# Altium footprint library Sajad_Altium_Library.PcbLib: 333 footprints (part 8 of 21)
Each footprint in its own frame and in the unit in brackets; x right, y up, seen from the top. Pads: shape width x height; smd on the part's side, far side on the other; paste and mask are expansions set on the pad; w line width, h text height; cw(c..) or ccw(c..) is an arc to the next point about the centre after c.
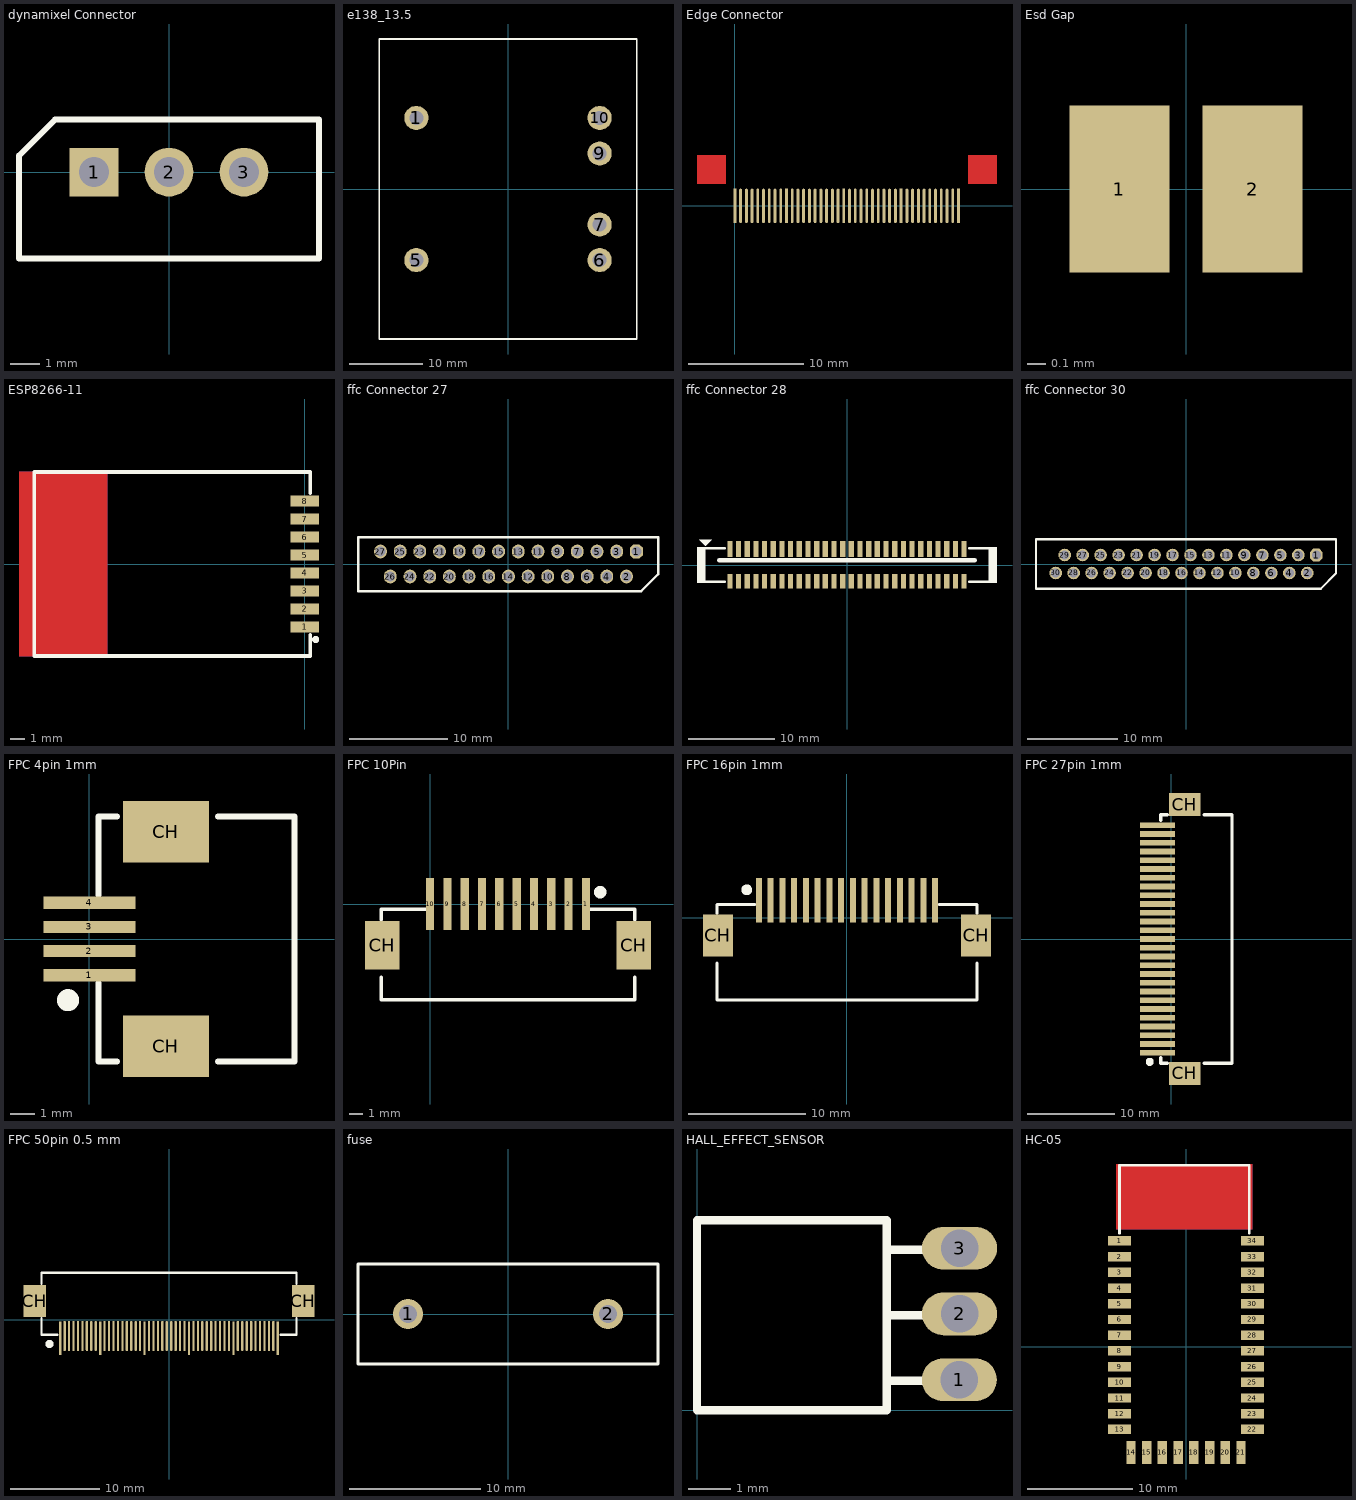
[diagram p7: the footprints below, top view; thin cyan lines are the x and y axes]

## dynamixel Connector [mil] "Dynamixel connector"
pads (3):
  rect 65x65 hole 40: 1(-100,0)
  round 65 hole 40: 2(0,0) 3(100,0)
Top Overlay:
  lines w7.87: -200,-115 -200,22 -152,70 200,70 200,-115 -200,-115

## e138_13.5 [mil] "On Board Transformer"
pads (6):
  round 130 hole 75: 1(-495,384) 5(-495,-384) 6(495,-384) 7(495,-192) 9(495,192) 10(495,384)
Top Overlay:
  lines w10: -695,-810 -695,810 695,810 695,-810 -695,-810
3D body: height 1200, standoff 0, extent -700,-815 700,815

## Edge Connector [mm]
height 1.7
pads (40):
  rect 0.25x3 smd: 1(19.5,0) 11(14.5,0) 21(9.5,0) 31(4.5,0) 40(0,0)
  oval 0.25x3 smd: 2(19,0) 3(18.5,0) 4(18,0) 5(17.5,0) 6(17,0) 7(16.5,0) 8(16,0) 9(15.5,0) 10(15,0) 12(14,0) 13(13.5,0) 14(13,0) 15(12.5,0) 16(12,0) 17(11.5,0) 18(11,0) 19(10.5,0) 20(10,0) 22(9,0) 23(8.5,0) 24(8,0) 25(7.5,0) 26(7,0) 27(6.5,0) 28(6,0) 29(5.5,0) 30(5,0) 32(4,0) 33(3.5,0) 34(3,0) 35(2.5,0) 36(2,0) 37(1.5,0) 38(1,0) 39(0.5,0)
Top Layer:
  rectangle: -3.302,1.905 -0.762,4.445
  rectangle: 20.32,1.905 22.86,4.445
3D body: height 1.24, standoff -0.03, extent -3.071,0.381 22.629,4.638

## Esd Gap [mil] "Esp Gap"
pads (2):
  rect 21x35 smd mask+3: 1(-14,0) 2(14,0)

## ESP8266-11 [mm]
height 1.7
pads (8):
  rect 2x0.762 smd: 1(0,-4.445) 2(0,-3.175) 3(0,-1.905) 4(0,-0.635) 5(0,0.635) 6(0,1.905) 7(0,3.175) 8(0,4.445)
Top Layer:
  pour cut-out: -20.193,-6.5 -20.193,6.5 -13.97,6.5 -13.97,-6.5
Bottom Layer:
  pour cut-out: -20.193,-6.5 -20.193,6.5 -13.97,6.5 -13.97,-6.5
Top Overlay:
  circle w0.25: c0.762,-5.334 r0.125
  lines w0.254: 0.381,-5 0.381,-6.5 -19.119,-6.5 -19.119,6.5 0.381,6.5 0.381,5

## ffc Connector 27 [mm] "ffc Connector 27"
pads (27):
  oct 1.3x1.397 hole 1: 1(13,1.27)
  oval 1.3x1.397 hole 1: 2(12,-1.27) 3(11,1.27) 4(10,-1.27) 5(9,1.27) 6(8,-1.27) 7(7,1.27) 8(6,-1.27) 9(5,1.27) 10(4,-1.27) 11(3,1.27) 12(2,-1.27) 13(1,1.27) 14(0,-1.27) 15(-1,1.27) 16(-2,-1.27) 17(-3,1.27) 18(-4,-1.27) 19(-5,1.27) 20(-6,-1.27) 21(-7,1.27) 22(-8,-1.27) 23(-9,1.27) 24(-10,-1.27) 25(-11,1.27) 26(-12,-1.27) 27(-13,1.27)
Top Overlay:
  lines w0.254: -15.283,-2.743 -15.283,2.743 15.197,2.743 15.197,-1.041 13.495,-2.743 -15.283,-2.743
3D body: height 5.5, standoff -3.01, extent -15.043,-1.3 14.957,1.3

## ffc Connector 28 [mm] "Molex Part Number: 52610-0533"
pads (56):
  rect 0.6x1.65 smd: 1(-13.5,-1.875) 2(-12.5,-1.875) 3(-11.5,-1.875) 4(-10.5,-1.875) 5(-9.5,-1.875) 6(-8.5,-1.875) 7(-7.5,-1.875) 8(-6.5,-1.875) 9(-5.5,-1.875) 10(-4.5,-1.875) 11(-3.5,-1.875) 12(-2.5,-1.875) 13(-1.5,-1.875) 14(-0.5,-1.875) 15(0.5,-1.875) 16(1.5,-1.875) 17(2.5,-1.875) 18(3.5,-1.875) 19(4.5,-1.875) 20(5.5,-1.875) 21(6.5,-1.875) 22(7.5,-1.875) 23(8.5,-1.875) 24(9.5,-1.875) 25(10.5,-1.875) 26(11.5,-1.875) 27(12.5,-1.875) 28(13.5,-1.875)
  rect 0.6x1.85 smd: 1(-13.5,1.875) 2(-12.5,1.875) 3(-11.5,1.875) 4(-10.5,1.875) 5(-9.5,1.875) 6(-8.5,1.875) 7(-7.5,1.875) 8(-6.5,1.875) 9(-5.5,1.875) 10(-4.5,1.875) 11(-3.5,1.875) 12(-2.5,1.875) 13(-1.5,1.875) 14(-0.5,1.875) 15(0.5,1.875) 16(1.5,1.875) 17(2.5,1.875) 18(3.5,1.875) 19(4.5,1.875) 20(5.5,1.875) 21(6.5,1.875) 22(7.5,1.875) 23(8.5,1.875) 24(9.5,1.875) 25(10.5,1.875) 26(11.5,1.875) 27(12.5,1.875) 28(13.5,1.875)
Top Overlay:
  region: -16.422,2.057 -17.297,2.057 -17.297,-2.057 -16.422,-2.057
  rectangle: 16.422,-2.057 17.297,2.057
  region: -17.031,2.946 -15.583,2.946 -16.294,2.235 -16.319,2.235
  lines w0.254: -14.072,-1.93 -16.425,-1.93 -16.425,1.93 -14.072,1.93 ; 14.072,-1.93 16.425,-1.93 16.425,1.93 14.072,1.93
  lines w0.508: -14.732,0.559 14.732,0.559
3D body: height 5.7, standoff -0.05, extent -17.3,-2.29 17.3,2.21

## ffc Connector 30 [mm] "ffc Connector 30"
pads (30):
  oct 1.397x1.397 hole 1: 1(14.5,1)
  round 1.397 hole 1: 2(13.5,-1) 3(12.5,1) 4(11.5,-1) 5(10.5,1) 6(9.5,-1) 7(8.5,1) 8(7.5,-1) 9(6.5,1) 10(5.5,-1) 11(4.5,1) 12(3.5,-1) 13(2.5,1) 14(1.5,-1) 15(0.5,1) 16(-0.5,-1) 17(-1.5,1) 18(-2.5,-1) 19(-3.5,1) 20(-4.5,-1) 21(-5.5,1) 22(-6.5,-1) 23(-7.5,1) 24(-8.5,-1) 25(-9.5,1) 26(-10.5,-1) 27(-11.5,1) 28(-12.5,-1) 29(-13.5,1) 30(-14.5,-1)
Top Overlay:
  lines w0.254: -16.383,2.743 -16.697,2.743 ; -16.697,2.743 -16.697,-2.743 14.995,-2.743 16.697,-1.041 16.697,2.743 -16.697,2.743

## FPC 4pin 1mm [mil] "Touch Connector"
height 66.93
pads (6):
  rect 150x20 smd: 1(0,-59.06) 2(0,-19.68) 3(0,19.69) 4(0,59.06)
  rect 140x100 smd: CH(125,-175) CH(125,175)
Top Overlay:
  circle w24: c-35,-100 r6
  lines w10: 15,-71.77 15,-200 45,-200 ; 15,71.77 15,200 45,200 ; 210,-200 335,-200 335,-15 335,200 210,200
3D body: height 106.15, standoff -0.15, extent -13.98,-202.75 336.42,202.76

## FPC 10Pin [mm] "Chess Connector"
height 1.7
pads (12):
  rect 0.6x3.81 smd: 1(11.43,0) 2(10.16,0) 3(8.89,0) 4(7.62,0) 5(6.35,0) 6(5.08,0) 7(3.81,0) 8(2.54,0) 9(1.27,0) 10(0,0)
  rect 2.54x3.556 smd: CH(-3.5,-3) CH(14.93,-3)
Top Overlay:
  circle w0.61: c12.47,0.889 r0.152
  lines w0.254: -3.581,-7 15.011,-7 ; -3.58,-7 -3.58,-5.334 ; -3.58,-1.143 -3.58,-0.381 -0.323,-0.381 ; 11.753,-0.381 15.01,-0.381 15.01,-1.143 ; 15.01,-7 15.01,-5.334

## FPC 16pin 1mm [mm] "Chess Connector"
height 1.7
pads (18):
  rect 0.508x3.81 smd: 1(-7.5,1.5) 2(-6.5,1.5) 3(-5.5,1.5) 4(-4.5,1.5) 5(-3.5,1.5) 6(-2.5,1.5) 7(-1.5,1.5) 8(-0.5,1.5) 9(0.5,1.5) 10(1.5,1.5) 11(2.5,1.5) 12(3.5,1.5) 13(4.5,1.5) 14(5.5,1.5) 15(6.5,1.5) 16(7.5,1.5)
  rect 2.54x3.556 smd: CH(-11,-1.5) CH(11,-1.5)
Top Overlay:
  circle w0.61: c-8.54,2.389 r0.152
  lines w0.254: -11.081,-7.009 11.08,-7.009 11.08,-3.834 ; -11.08,-7.009 -11.08,-3.834 ; -11.08,0.357 -11.08,1.119 -7.823,1.119 ; 7.823,1.119 11.08,1.119 11.08,0.357

## FPC 27pin 1mm [mm] "1027-A0 FPC1.0"
height 1.7
pads (29):
  rect 4x0.65 smd: 1(-1.556,-13) 2(-1.556,-12) 3(-1.556,-11) 4(-1.556,-10) 5(-1.556,-9) 6(-1.556,-8) 7(-1.556,-7) 8(-1.556,-6) 9(-1.556,-5) 10(-1.556,-4) 11(-1.556,-3) 12(-1.556,-2) 13(-1.556,-1) 14(-1.556,0) 15(-1.556,1) 16(-1.556,2) 17(-1.556,3) 18(-1.556,4) 19(-1.556,5) 20(-1.556,6) 21(-1.556,7) 22(-1.556,8) 23(-1.556,9) 24(-1.556,10) 25(-1.556,11) 26(-1.556,12) 27(-1.556,13)
  rect 3.556x2.6 smd: CH(1.556,-15.367) CH(1.556,15.367)
Top Overlay:
  circle w0.61: c-2.445,-14.04 r0.152
  lines w0.381: -1.175,-13.589 -1.175,-14.2 -0.413,-14.2 ; -1.175,13.589 -1.175,14.2 -0.413,14.2 ; 3.778,-14.2 6.953,-14.2 6.953,14.2 3.778,14.2

## FPC 50pin 0.5 mm [mil] "FPC 50pin .5 mm"
height 66.93
pads (52):
  rect 9.84x150 smd: 1(-482.28,-82.5) 10(-305.12,-82.5) 20(-108.27,-82.5) 30(88.58,-82.5) 40(285.43,-82.5) 50(482.28,-82.5)
  oval 9.84x134 smd: 2(-462.6,-72.5) 3(-442.91,-72.5) 4(-423.23,-72.5) 5(-403.54,-72.5) 6(-383.86,-72.5) 7(-364.17,-72.5) 8(-344.49,-72.5) 9(-324.8,-72.5) 11(-285.43,-72.5) 12(-265.75,-72.5) 13(-246.06,-72.5) 14(-226.38,-72.5) 15(-206.69,-72.5) 16(-187.01,-72.5) 17(-167.32,-72.5) 18(-147.64,-72.5) 19(-127.95,-72.5) 21(-88.58,-72.5) 22(-68.9,-72.5) 23(-49.21,-72.5) 24(-29.53,-72.5) 25(-9.84,-72.5) 26(9.84,-72.5) 27(29.53,-72.5) 28(49.21,-72.5) 29(68.9,-72.5) 31(108.27,-72.5) 32(127.95,-72.5) 33(147.64,-72.5) 34(167.32,-72.5) 35(187.01,-72.5) 36(206.69,-72.5) 37(226.38,-72.5) 38(246.06,-72.5) 39(265.75,-72.5) 41(305.12,-72.5) 42(324.8,-72.5) 43(344.49,-72.5) 44(364.17,-72.5) 45(383.86,-72.5) 46(403.54,-72.5) 47(423.23,-72.5) 48(442.91,-72.5) 49(462.6,-72.5)
  rect 100x140 smd: CH(-595,82.5) CH(595,82.5)
Top Overlay:
  circle w24: c-530,-107.5 r6
  lines w10: -565,7.5 -565,-67.5 -495,-67.5 ; -565,157.5 -565,207.5 565,207.5 565,157.5 ; 495,-67.5 565,-67.5 565,7.5
3D body: height 78.74, standoff -1.97, extent -600.4,-73.63 600.38,207.87

## fuse [mil]
pads (2):
  round 90 hole 55: 1(-300,0) 2(300,0)
Top Overlay:
  lines w7.87: -450,-150 450,-150 450,150 -450,150 -450,-150
3D body: height 561.5, standoff -63.14, extent -472.44,-182.85 472.44,174.72

## HALL_EFFECT_SENSOR [mil]
pads (3):
  oval 70x40 hole 35: 1(244.82,28.38) 2(245.04,89.86) 3(245.04,151.13)
Top Overlay:
  lines w7.87: 177.17,27.56 236.22,27.56 ; 177.17,88.58 236.22,88.58 ; 177.17,149.61 236.22,149.61 ; 0,0 177.17,0 177.17,177.17 0,177.17 0,0

## HC-05 [mm] "Bluetooth module footprint"
height 1.7
pads (34):
  rect 2.2x0.9 smd: 1(-6.35,10.1) 2(-6.35,8.6) 3(-6.35,7.1) 4(-6.35,5.6) 5(-6.35,4.1) 6(-6.35,2.6) 7(-6.35,1.1) 8(-6.35,-0.4) 9(-6.35,-1.9) 10(-6.35,-3.4) 11(-6.35,-4.9) 12(-6.35,-6.4) 13(-6.35,-7.9) 22(6.35,-7.9) 23(6.35,-6.4) 24(6.35,-4.9) 25(6.35,-3.4) 26(6.35,-1.9) 27(6.35,-0.4) 28(6.35,1.1) 29(6.35,2.6) 30(6.35,4.1) 31(6.35,5.6) 32(6.35,7.1) 33(6.35,8.6) 34(6.35,10.1)
  rect 0.9x2.2 smd: 14(-5.25,-10.1) 15(-3.75,-10.1) 16(-2.25,-10.1) 17(-0.75,-10.1) 18(0.75,-10.1) 19(2.25,-10.1) 20(3.75,-10.1) 21(5.25,-10.1)
Top Layer:
  pour cut-out: -6.654,17.449 6.346,17.449 6.346,11.226 -6.654,11.226
Bottom Layer:
  pour cut-out: -6.654,17.449 6.346,17.449 6.346,11.226 -6.654,11.226
Top Overlay:
  lines w0.254: -6.35,10.82 -6.35,17.322 6.043,17.322 6.043,10.848
3D body: height 0.8, standoff -1.64, extent -6.35,-9.423 6.37,17.587